# Altium schematic symbol library Electronic Devices_LIB.SchLib: 703 symbols (part 4 of 8)
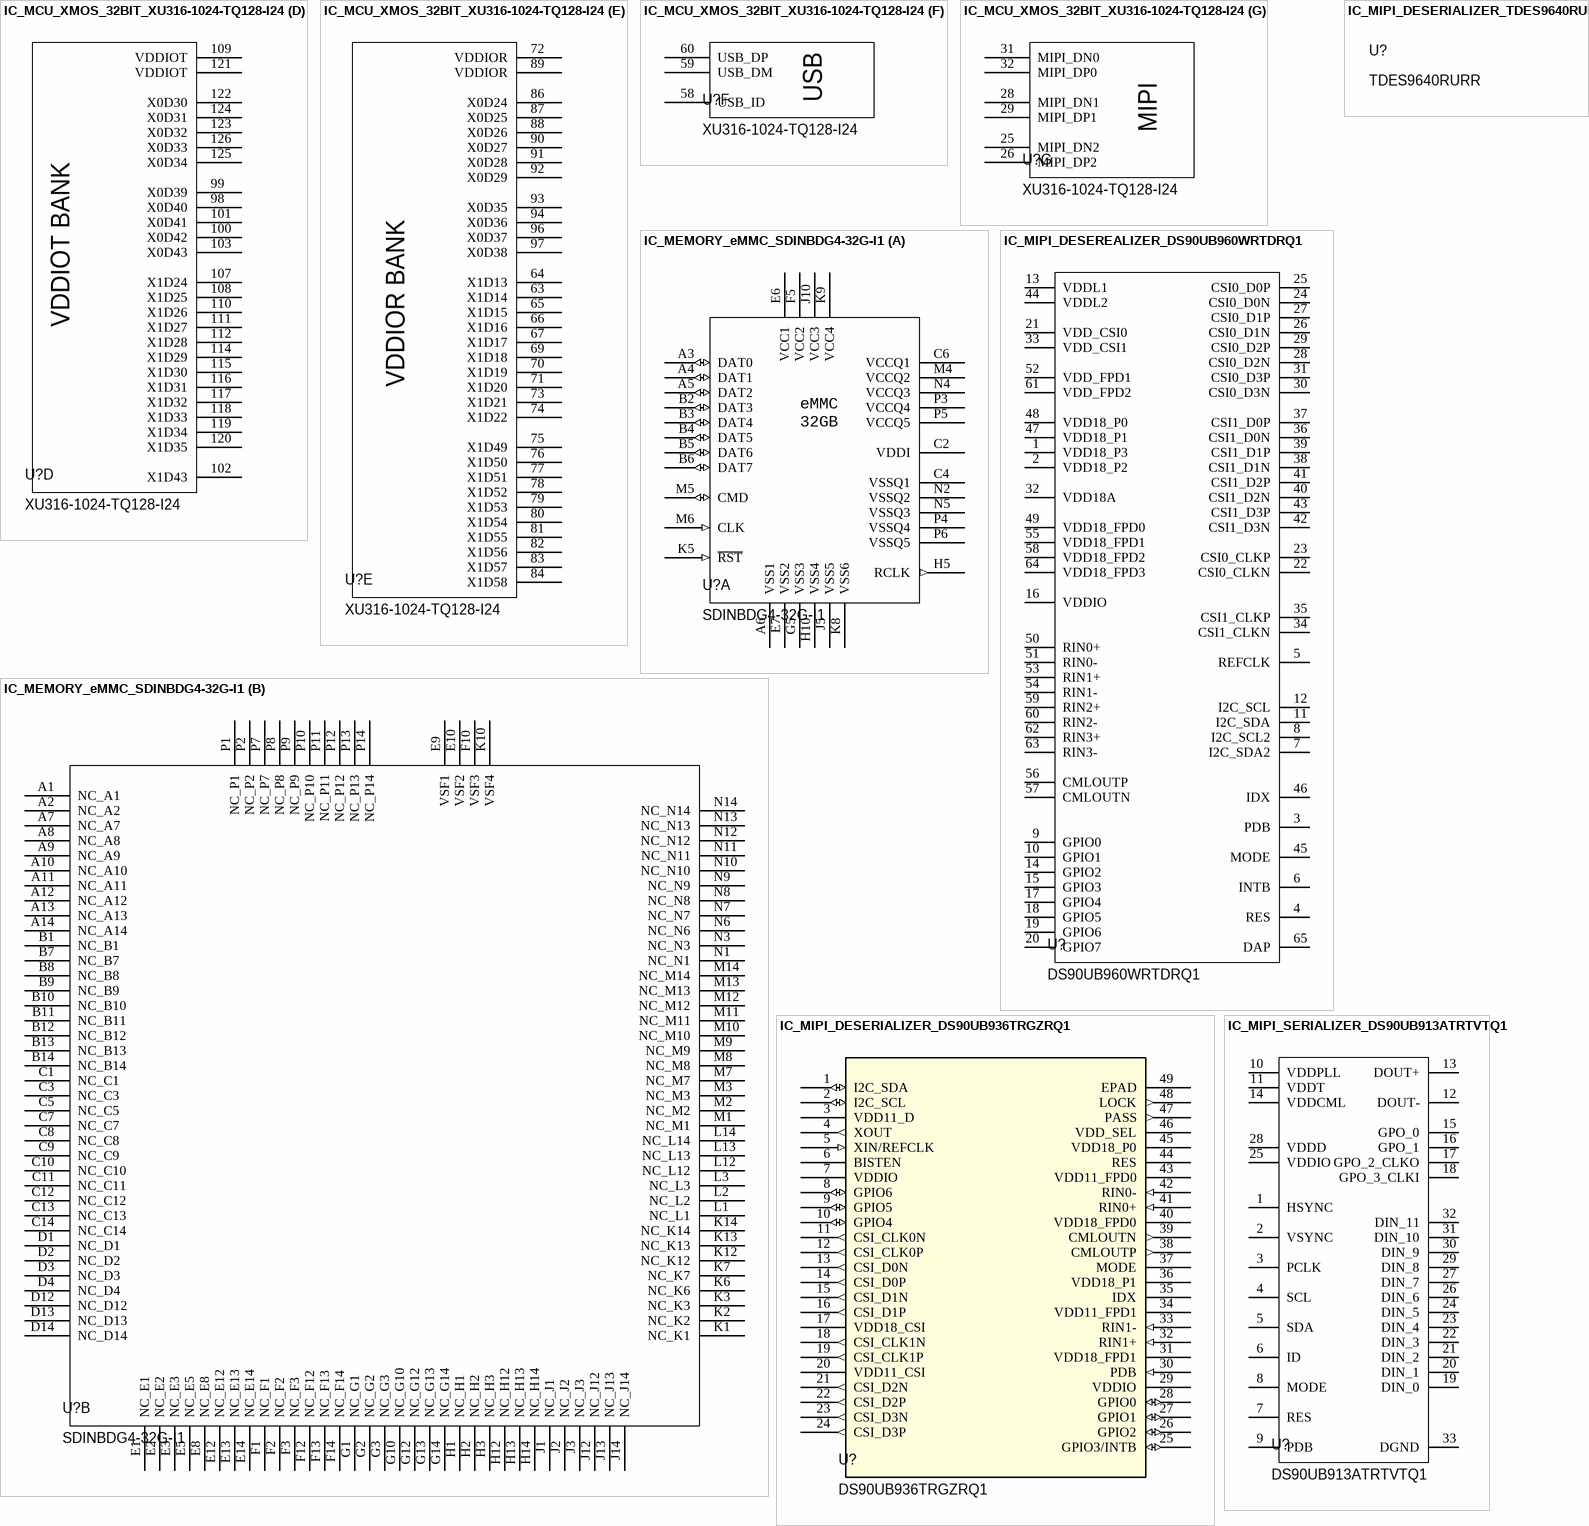
[diagram p39: symbols IC_MCU_XMOS_32BIT_XU316-1024-TQ128-I24 to IC_MIPI_SERIALIZER_DS90UB913ATRTVTQ1]

## IC_MIPI_DESERIALIZER_TDES9640RURR
designator U?, comment TDES9640RURR
7.55-Gbps MIPI® CSI-2 V³Link™ deserializer quad hub for high speed sensors 88-VQFNP -20 to 85; Manufacturer: Texas Instruments; Supplier 1: Digikey; Manufacturer Part Number: TDES9640RURR; RoHS: No; Stock 1: 2500; Pricing 1: 1=23.12, 10=18.537, 25=17.392, 100=16.1339, 250=15.53412, 500=15.17266, 2500=13.825 (USD); Supplier Part Number 1: 296-TDES9640RURRCT-ND

## IC_MIPI_SERIALIZER_DS90UB913ATRTVTQ1
designator U?, comment DS90UB913ATRTVTQ1
25- to 100-MHz, 10-bit & 12-bit FPD-Link III serializer 32-WQFN -40 to 105; Manufacturer: Texas Instruments; Number of Inputs: 12; Number of Outputs: 1; Max Supply Voltage: 1.89V; Min Supply Voltage: 1.71V; Operating Supply Voltage: 1.8V; Data Rate: 1.4Gbps; Supplier 1: Texas Instruments; Manufacturer Part Number: DS90UB913ATRTVTQ1; RoHS: Yes; Category: Integrated Circuits (ICs); Stock 1: 19901; Pricing 1: 1=6.813, 100=5.951, 250=4.588, 1000=4.104 (USD); Mount: Surface Mount; Number of Pins: 32; Min Operating Temperature: -40°C; Max Operating Temperature: 105°C; Packaging: Tape and Reel; Package Quantity: 250; Number of Elements: 1; Number of Drivers: 1; Series: Automotive, AEC-Q100; Radiation Hardening: No; Lead Free: Lead Free; RoHS Compliant: Yes; ComponentLink1URL: https://datasheet.ciiva.com/25651/ds90ub913a-q1-25651275.pdf?src-supplier=Digikey; ComponentLink1Description: https://datasheet.ciiva.com/25651/ds90ub913a-q1-25651275.pdf?src-supplier=Digikey; ComponentLink2URL: https://datasheet.ciiva.com/18624/ds90ub913a-q1-18624572.pdf?src-supplier=Digikey; ComponentLink2Description: https://datasheet.ciiva.com/18624/ds90ub913a-q1-18624572.pdf?src-supplier=Digikey; ComponentLink3URL: https://datasheet.ciiva.com/29643/ds90ub913a-q1-29643738.pdf?src-supplier=Digikey; ComponentLink3Description: https://datasheet.ciiva.com/29643/ds90ub913a-q1-29643738.pdf?src-supplier=Digikey; ComponentLink4URL: https://datasheet.ciiva.com/29891/ds90ub913a-q1-29891386.pdf?src-supplier=Avnet; ComponentLink4Description: https://datasheet.ciiva.com/29891/ds90ub913a-q1-29891386.pdf?src-supplier=Avnet; Supplier Part Number 1: DS90UB913ATRTVTQ1
footprint IC_SERIALIZER_QFN50P500X500X80-33N
pins: 1 HSYNC, 2 VSYNC, 3 PCLK, 4 SCL, 5 SDA, 6 ID, 7 RES, 8 MODE, 9 PDB, 10 VDDPLL (power), 11 VDDT (power), 12 DOUT-, 13 DOUT+, 14 VDDCML (power), 15 GPO_0, 16 GPO_1, 17 GPO_2_CLKO, 18 GPO_3_CLKI, 19 DIN_0, 20 DIN_1, 21 DIN_2, 22 DIN_3, 23 DIN_4, 24 DIN_5, 25 VDDIO, 26 DIN_6, 27 DIN_7, 28 VDDD, 29 DIN_8, 30 DIN_9, 31 DIN_10, 32 DIN_11, 33 DGND

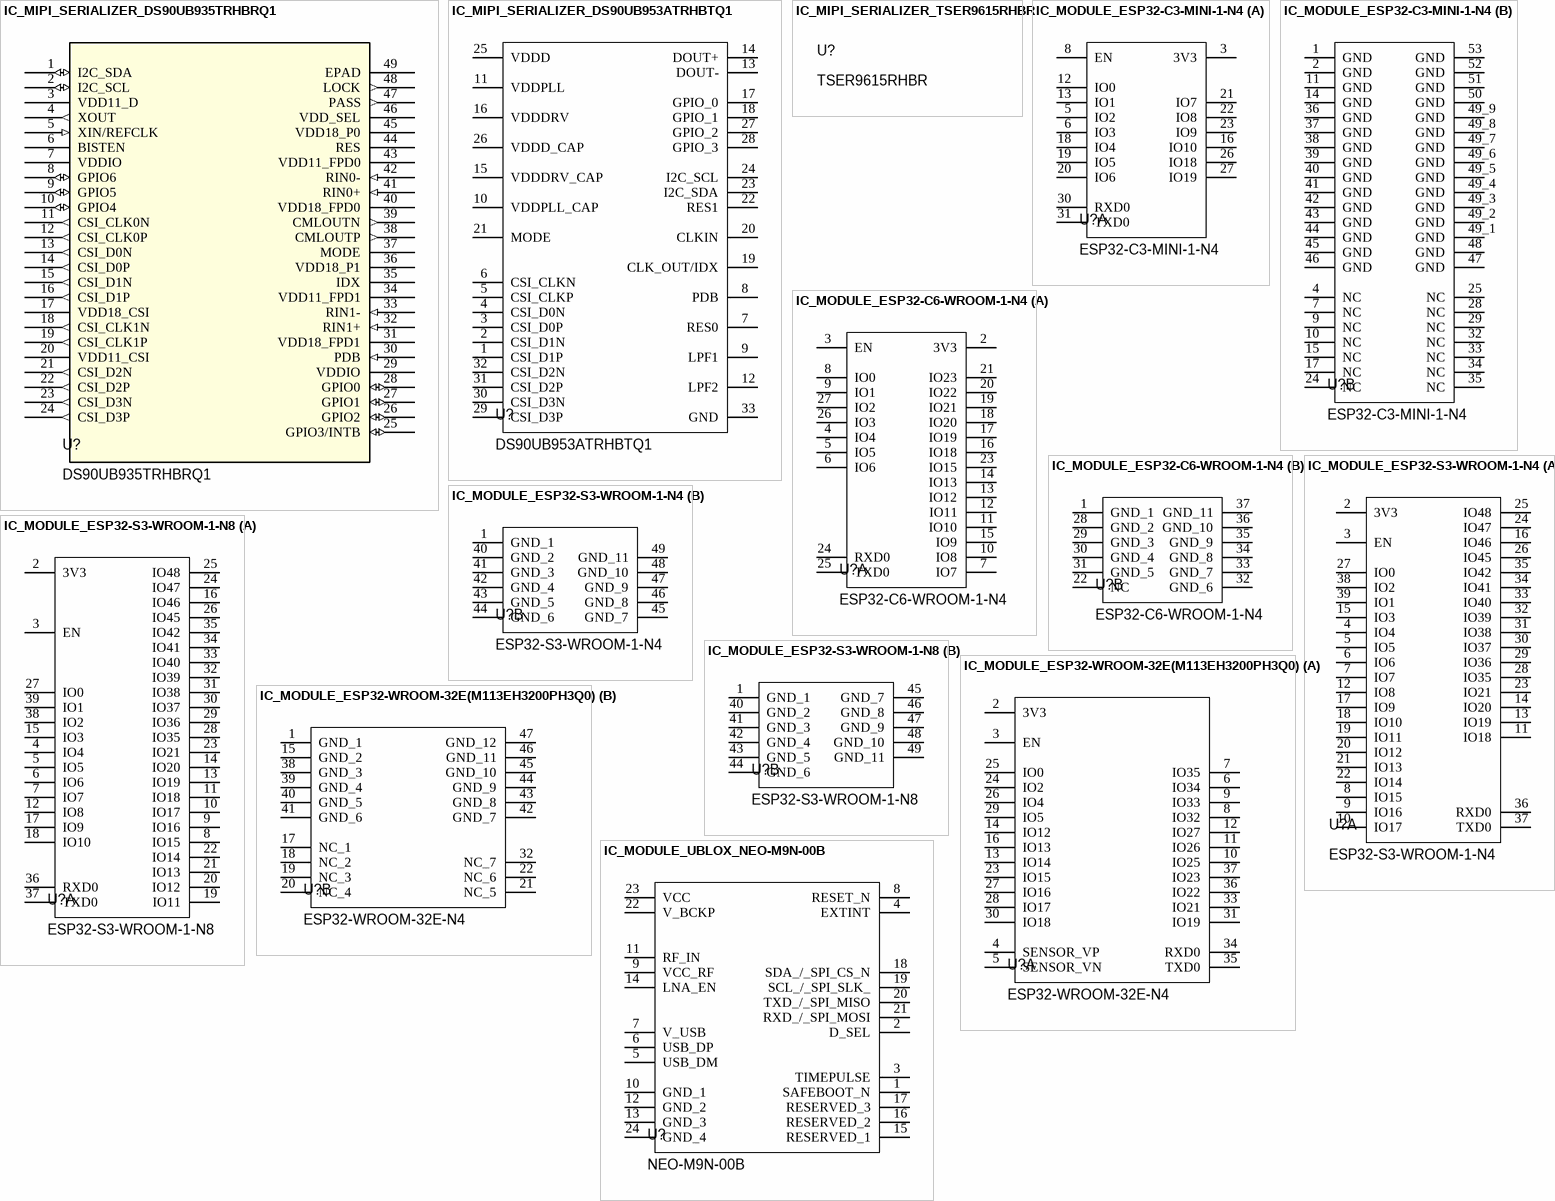
[diagram p14: symbols IC_MIPI_SERIALIZER_DS90UB935TRHBRQ1 to IC_MODULE_UBLOX_NEO-M9N-00B]

## IC_MIPI_SERIALIZER_DS90UB935TRHBRQ1
designator U?, comment DS90UB935TRHBRQ1
FPD-Link III 3-Gbps serializer with CSI-2 interface for 1 MP & 60 fps 32-VQFN -40 to 105; Manufacturer: Texas Instruments; Data Rate: 3Gbps; Number of Inputs: 10; Number of Outputs: 2; Supplier 1: Digikey; Manufacturer Part Number: DS90UB935TRHBRQ1; RoHS: Yes; Category: Integrated Circuits (ICs); Stock 1: 4984; Pricing 1: 1=6.91, 10=5.321, 25=4.9248, 100=4.4893, 250=4.28156, 500=4.15638, 1000=4.05336 (USD); Mount: Surface Mount; Case/Package: VQFN; Number of Pins: 32; Min Operating Temperature: -40°C; Max Operating Temperature: 105°C; Packaging: Cut Tape; Series: Automotive, AEC-Q100; Length: 5mm; Width: 5mm; Height: 1mm; Thickness: 900um; RoHS Compliant: Yes; ComponentLink1URL: http://www.ti.com/general/docs/suppproductinfo.tsp?distId=10&amp;gotoUrl=http%3A%2F%2Fwww.ti.com%2Flit%2Fgpn%2Fds90ub935-q1&src-supplier=Digikey; ComponentLink1Description: http://www.ti.com/general/docs/suppproductinfo.tsp?distId=10&amp;gotoUrl=http%3A%2F%2Fwww.ti.com%2Flit%2Fgpn%2Fds90ub935-q1&src-supplier=Digikey; Supplier Part Number 1: 296-51100-1-ND
footprint IC_SERIALIZER_RGZ48_TEX
pins: 1 I2C_SDA (io), 2 I2C_SCL (io), 3 VDD11_D (power), 4 XOUT (out), 5 XIN/REFCLK (in), 6 BISTEN, 7 VDDIO (power), 8 GPIO6 (io), 9 GPIO5 (io), 10 GPIO4 (io), 11 CSI_CLK0N (out), 12 CSI_CLK0P (out), 13 CSI_D0N (out), 14 CSI_D0P (out), 15 CSI_D1N (out), 16 CSI_D1P (out), 17 VDD18_CSI (power), 18 CSI_CLK1N (out), 19 CSI_CLK1P (out), 20 VDD11_CSI (power), 21 CSI_D2N (out), 22 CSI_D2P (out), 23 CSI_D3N (out), 24 CSI_D3P (out), 25 GPIO3/INTB (io), 26 GPIO2 (io), 27 GPIO1 (io), 28 GPIO0 (io), 29 VDDIO (power), 30 PDB (in), 31 VDD18_FPD1 (power), 32 RIN1+ (in), 33 RIN1- (in), 34 VDD11_FPD1 (power), 35 IDX, 36 VDD18_P1 (power), 37 MODE, 38 CMLOUTP (out), 39 CMLOUTN (out), 40 VDD18_FPD0 (power), 41 RIN0+ (in), 42 RIN0- (in), 43 VDD11_FPD0 (power), 44 RES, 45 VDD18_P0 (power), 46 VDD_SEL (power), 47 PASS (out), 48 LOCK (out), 49 EPAD

## IC_MIPI_SERIALIZER_DS90UB953ATRHBTQ1
designator U?, comment DS90UB953ATRHBTQ1
FPD-Link III 4.16-Gbps serializer with CSI-2 interface 32-VQFN -40 to 125; Manufacturer: Texas Instruments; Data Rate: 4.16Gbps; Number of Inputs: 5; Number of Outputs: 1; Supplier 1: Texas Instruments; Manufacturer Part Number: DS90UB953ATRHBTQ1; RoHS: Yes; Category: Integrated Circuits (ICs); Stock 1: 15937; Pricing 1: 1=10.375, 100=9.063, 250=6.988, 1000=6.25 (USD); Mount: Surface Mount; Case/Package: VQFN; Min Operating Temperature: -40°C; Max Operating Temperature: 125°C; Series: Automotive, AEC-Q100; ComponentLink1URL: http://www.ti.com/general/docs/suppproductinfo.tsp?distId=10&amp;gotoUrl=http%3A%2F%2Fwww.ti.com%2Flit%2Fgpn%2Fds90ub953a-q1&src-supplier=Digikey; ComponentLink1Description: http://www.ti.com/general/docs/suppproductinfo.tsp?distId=10&amp;gotoUrl=http%3A%2F%2Fwww.ti.com%2Flit%2Fgpn%2Fds90ub953a-q1&src-supplier=Digikey; Supplier Part Number 1: DS90UB953ATRHBTQ1
footprint IC_SERIALIZER_QFN50P500X500X100-33N-D
pins: 1 CSI_D1P, 2 CSI_D1N, 3 CSI_D0P, 4 CSI_D0N, 5 CSI_CLKP, 6 CSI_CLKN, 7 RES0, 8 PDB, 9 LPF1, 10 VDDPLL_CAP, 11 VDDPLL, 12 LPF2, 13 DOUT-, 14 DOUT+, 15 VDDDRV_CAP, 16 VDDDRV, 17 GPIO_0, 18 GPIO_1, 19 CLK_OUT/IDX, 20 CLKIN, 21 MODE, 22 RES1, 23 I2C_SDA, 24 I2C_SCL, 25 VDDD, 26 VDDD_CAP, 27 GPIO_2, 28 GPIO_3, 29 CSI_D3P, 30 CSI_D3N, 31 CSI_D2P, 32 CSI_D2N, 33 GND

## IC_MIPI_SERIALIZER_TSER9615RHBR
designator U?, comment TSER9615RHBR
7.55-Gbps MIPI® CSI-2 V³Link™ serializer for high-speed sensors 32-VQFN -20 to 85; Manufacturer: Texas Instruments; Supplier 1: Digikey; Manufacturer Part Number: TSER9615RHBR; RoHS: No; Stock 1: 3000; Pricing 1: 1=9.34, 10=7.269, 25=6.752, 100=6.1835, 250=5.9124, 500=5.74902, 1000=5.61455, 3000=5.1125 (USD); Case/Package: VQFN; Number of Pins: 32; Length: 5mm; Width: 5mm; Height: 1mm; Thickness: 900um; Supplier Part Number 1: 296-TSER9615RHBRCT-ND

## IC_MODULE_ESP32-C3-MINI-1-N4
designator U?, comment ESP32-C3-MINI-1-N4
Multiprotocol Modules SMD module, ESP32-C3FN4, PCB antenna, -40 C +85 C; Manufacturer: Espressif Systems; Supplier 1: Digikey; Manufacturer Part Number: ESP32-C3-MINI-1-N4; RoHS: No; Category: LDO; Stock 1: 26373; Pricing 1: 1=1.8 (USD); ComponentLink1URL: https://datasheet.octopart.com/ESP32-C3-MINI-1-N4-Espressif-Systems-datasheet-165560559.pdf?src-supplier=TME; ComponentLink1Description: https://datasheet.octopart.com/ESP32-C3-MINI-1-N4-Espressif-Systems-datasheet-165560559.pdf?src-supplier=TME; ComponentLink2URL: https://datasheet.octopart.com/ESP32-C3-MINI-1-N4-Espressif-Systems-datasheet-154717747.pdf?src-supplier=SOS+electronic; ComponentLink2Description: https://datasheet.octopart.com/ESP32-C3-MINI-1-N4-Espressif-Systems-datasheet-154717747.pdf?src-supplier=SOS+electronic; Supplier Part Number 1: 1965-ESP32-C3-MINI-1-N4CT-ND
footprint XCVR_ESP32-C3-MINI-1-N4
part A pins: 3 3V3, 5 IO2, 6 IO3, 8 EN, 12 IO0, 13 IO1, 16 IO10, 18 IO4, 19 IO5, 20 IO6, 21 IO7, 22 IO8, 23 IO9, 26 IO18, 27 IO19, 30 RXD0, 31 TXD0
part B pins: 1 GND (power), 2 GND (power), 4 NC, 7 NC, 9 NC, 10 NC, 11 GND (power), 14 GND (power), 15 NC, 17 NC, 24 NC, 25 NC, 28 NC, 29 NC, 32 NC, 33 NC, 34 NC, 35 NC, 36 GND (power), 37 GND (power), 38 GND (power), 39 GND (power), 40 GND (power), 41 GND (power), 42 GND (power), 43 GND (power), 44 GND (power), 45 GND (power), 46 GND (power), 47 GND (power), 48 GND (power), 49_1 GND (power), 49_2 GND (power), 49_3 GND (power), 49_4 GND (power), 49_5 GND (power), 49_6 GND (power), 49_7 GND (power), 49_8 GND (power), 49_9 GND (power), 50 GND (power), 51 GND (power), 52 GND (power), 53 GND (power)

## IC_MODULE_ESP32-C6-WROOM-1-N4
designator U?, comment ESP32-C6-WROOM-1-N4
ESP32-C6-WROOM-1-N4 Engineering Module - 4 MB Quad SPI Flash; Manufacturer: Espressif Systems; Supplier 1: Digikey; Manufacturer Part Number: ESP32-C6-WROOM-1-N4; RoHS: No; Category: LDO; Stock 1: 4715; Pricing 1: 1=2.85 (USD); Supplier Part Number 1: 1965-ESP32-C6-WROOM-1-N4CT-ND
footprint IC_MODULE_ESP32C6WROOM1N4
part A pins: 2 3V3, 3 EN, 4 IO4, 5 IO5, 6 IO6, 7 IO7, 8 IO0, 9 IO1, 10 IO8, 11 IO10, 12 IO11, 13 IO12, 14 IO13, 15 IO9, 16 IO18, 17 IO19, 18 IO20, 19 IO21, 20 IO22, 21 IO23, 23 IO15, 24 RXD0, 25 TXD0, 26 IO3, 27 IO2
part B pins: 1 GND_1, 22 NC, 28 GND_2, 29 GND_3, 30 GND_4, 31 GND_5, 32 GND_6, 33 GND_7, 34 GND_8, 35 GND_9, 36 GND_10, 37 GND_11

## IC_MODULE_ESP32-S3-WROOM-1-N4
designator U?, comment ESP32-S3-WROOM-1-N4
WiFi-Modul 802.11/BT 2, 4-2, 5GHz 150Mb/s; Manufacturer: Espressif Systems; Supplier 1: Digi-Key; Manufacturer Part Number: ESP32-S3-WROOM-1-N4; RoHS: No; Category: Uncategorized; Stock 1: 1280; Pricing 1: 1=2.95 (USD); Supplier Part Number 1: 1965-ESP32-S3-WROOM-1-N4CT-ND
footprint IC_MODULE_ESP32S3WROOM1N4 (41-SMD Module)
part A pins: 2 3V3, 3 EN, 4 IO4, 5 IO5, 6 IO6, 7 IO7, 8 IO15, 9 IO16, 10 IO17, 11 IO18, 12 IO8, 13 IO19, 14 IO20, 15 IO3, 16 IO46, 17 IO9, 18 IO10, 19 IO11, 20 IO12, 21 IO13, 22 IO14, 23 IO21, 24 IO47, 25 IO48, 26 IO45, 27 IO0, 28 IO35, 29 IO36, 30 IO37, 31 IO38, 32 IO39, 33 IO40, 34 IO41, 35 IO42, 36 RXD0, 37 TXD0, 38 IO2, 39 IO1
part B pins: 1 GND_1, 40 GND_2, 41 GND_3, 42 GND_4, 43 GND_5, 44 GND_6, 45 GND_7, 46 GND_8, 47 GND_9, 48 GND_10, 49 GND_11

## IC_MODULE_ESP32-S3-WROOM-1-N8
designator U?, comment ESP32-S3-WROOM-1-N8
SMD module, ESP32-S3, 8 MB SPI flash, PCB antenna; Manufacturer: Espressif Systems; Supplier 1: Digikey; Manufacturer Part Number: ESP32-S3-WROOM-1-N8; RoHS: No; Category: LDO; Stock 1: 4985; Pricing 1: 1=3.2 (USD); ComponentLink1URL: https://datasheet.octopart.com/ESP32-S3-WROOM-1-N8-Espressif-Systems-datasheet-165560563.pdf?src-supplier=TME; ComponentLink1Description: https://datasheet.octopart.com/ESP32-S3-WROOM-1-N8-Espressif-Systems-datasheet-165560563.pdf?src-supplier=TME; Supplier Part Number 1: 1965-ESP32-S3-WROOM-1-N8CT-ND
footprint IC_MODULE_ESP32S3WROOM1N8
part A pins: 2 3V3, 3 EN, 4 IO4, 5 IO5, 6 IO6, 7 IO7, 8 IO15, 9 IO16, 10 IO17, 11 IO18, 12 IO8, 13 IO19, 14 IO20, 15 IO3, 16 IO46, 17 IO9, 18 IO10, 19 IO11, 20 IO12, 21 IO13, 22 IO14, 23 IO21, 24 IO47, 25 IO48, 26 IO45, 27 IO0, 28 IO35, 29 IO36, 30 IO37, 31 IO38, 32 IO39, 33 IO40, 34 IO41, 35 IO42, 36 RXD0, 37 TXD0, 38 IO2, 39 IO1
part B pins: 1 GND_1, 40 GND_2, 41 GND_3, 42 GND_4, 43 GND_5, 44 GND_6, 45 GND_7, 46 GND_8, 47 GND_9, 48 GND_10, 49 GND_11

## IC_MODULE_ESP32-WROOM-32E(M113EH3200PH3Q0)
designator U?, comment ESP32-WROOM-32E-N4
SMD module, ESP32-D0WD-V3, ESP32 ECO V3, 4 MB SPI flash, PCB antenna; Manufacturer: Espressif Systems; Manufacturer Part Number: ESP32-WROOM-32E(M113EH3200PH3Q0); Supplier 1: Digi-Key; RoHS: No; Category: RF Receivers, Transceivers; Stock 1: 13000; Pricing 1: 650=2.94 (USD); Supplier Part Number 1: 1965-ESP32-WROOM-32E-N4TR-ND
footprint IC_MODULE_ESP32WROOM32EN4 (38-SMD Module)
part A pins: 2 3V3, 3 EN, 4 SENSOR_VP, 5 SENSOR_VN, 6 IO34, 7 IO35, 8 IO32, 9 IO33, 10 IO25, 11 IO26, 12 IO27, 13 IO14, 14 IO12, 16 IO13, 23 IO15, 24 IO2, 25 IO0, 26 IO4, 27 IO16, 28 IO17, 29 IO5, 30 IO18, 31 IO19, 33 IO21, 34 RXD0, 35 TXD0, 36 IO22, 37 IO23
part B pins: 1 GND_1, 15 GND_2, 17 NC_1, 18 NC_2, 19 NC_3, 20 NC_4, 21 NC_5, 22 NC_6, 32 NC_7, 38 GND_3, 39 GND_4, 40 GND_5, 41 GND_6, 42 GND_7, 43 GND_8, 44 GND_9, 45 GND_10, 46 GND_11, 47 GND_12

## IC_MODULE_UBLOX_NEO-M9N-00B
designator U?, comment NEO-M9N-00B
GNSS module, Flash, TCXO, SAW, LNA, LCC, 12x16 mm Professional Grade; Manufacturer: u-blox; Supplier 1: Mouser; Manufacturer Part Number: NEO-M9N-00B; RoHS: Yes; Category: RF Receivers, Transceivers; Stock 1: 8287; Pricing 1: 1=27, 10=23.92, 50=19.61, 100=15.68, 250=15.68, 1000=15.68, 10000=15.68 (USD); RoHS Compliant: Yes; ComponentLink1URL: https://datasheet.octopart.com/NEO-M9N-00B-u-blox-datasheet-166813760.pdf?src-supplier=Future+Electronics; ComponentLink1Description: https://datasheet.octopart.com/NEO-M9N-00B-u-blox-datasheet-166813760.pdf?src-supplier=Future+Electronics; ComponentLink2URL: https://datasheet.octopart.com/NEO-M9N-00B-u-blox-datasheet-166811447.pdf?src-supplier=TME; ComponentLink2Description: https://datasheet.octopart.com/NEO-M9N-00B-u-blox-datasheet-166811447.pdf?src-supplier=TME; Supplier Part Number 1: 377-NEO-M9N-00B
footprint IC_MODULE_UBLOX_NEOM9N00B
pins: 1 SAFEBOOT_N, 2 D_SEL, 3 TIMEPULSE, 4 EXTINT, 5 USB_DM, 6 USB_DP, 7 V_USB, 8 RESET_N, 9 VCC_RF, 10 GND_1, 11 RF_IN, 12 GND_2, 13 GND_3, 14 LNA_EN, 15 RESERVED_1, 16 RESERVED_2, 17 RESERVED_3, 18 SDA_/_SPI_CS_N, 19 SCL_/_SPI_SLK_, 20 TXD_/_SPI_MISO, 21 RXD_/_SPI_MOSI, 22 V_BCKP, 23 VCC, 24 GND_4

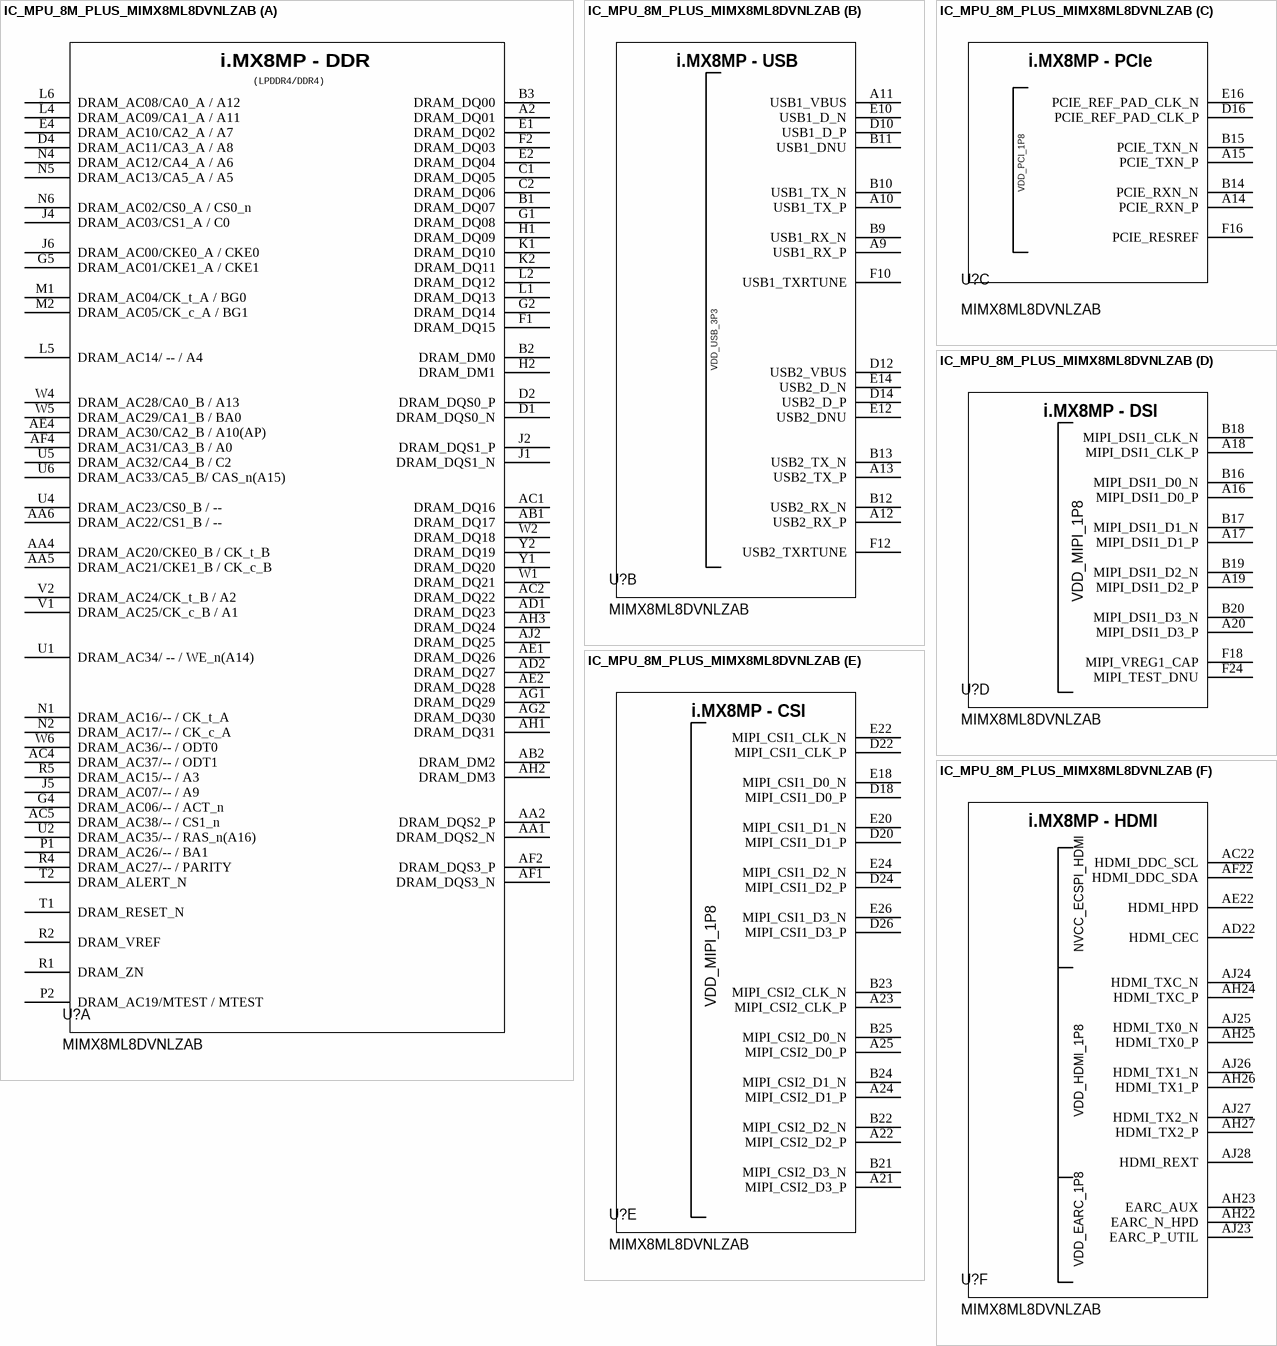
[diagram p15: symbol IC_MPU_8M_PLUS_MIMX8ML8DVNLZAB]

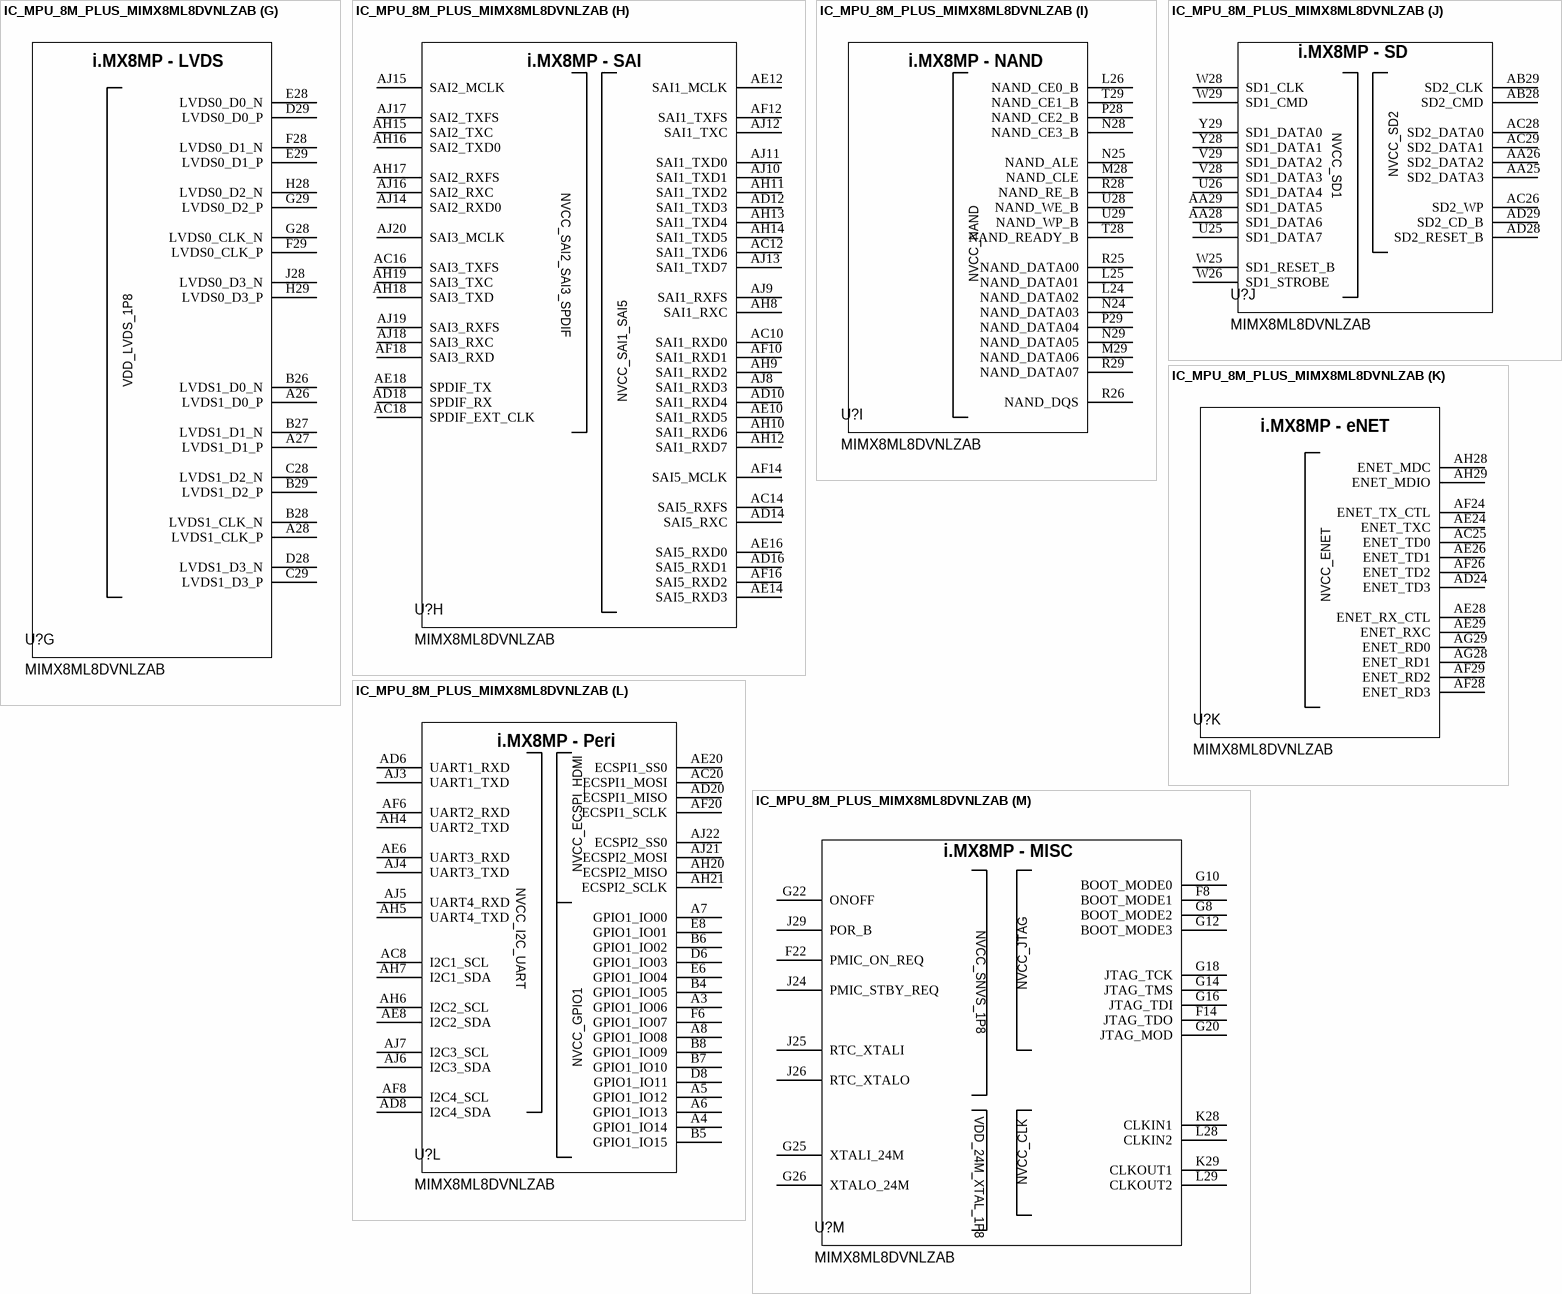
[diagram p16: symbol IC_MPU_8M_PLUS_MIMX8ML8DVNLZAB]

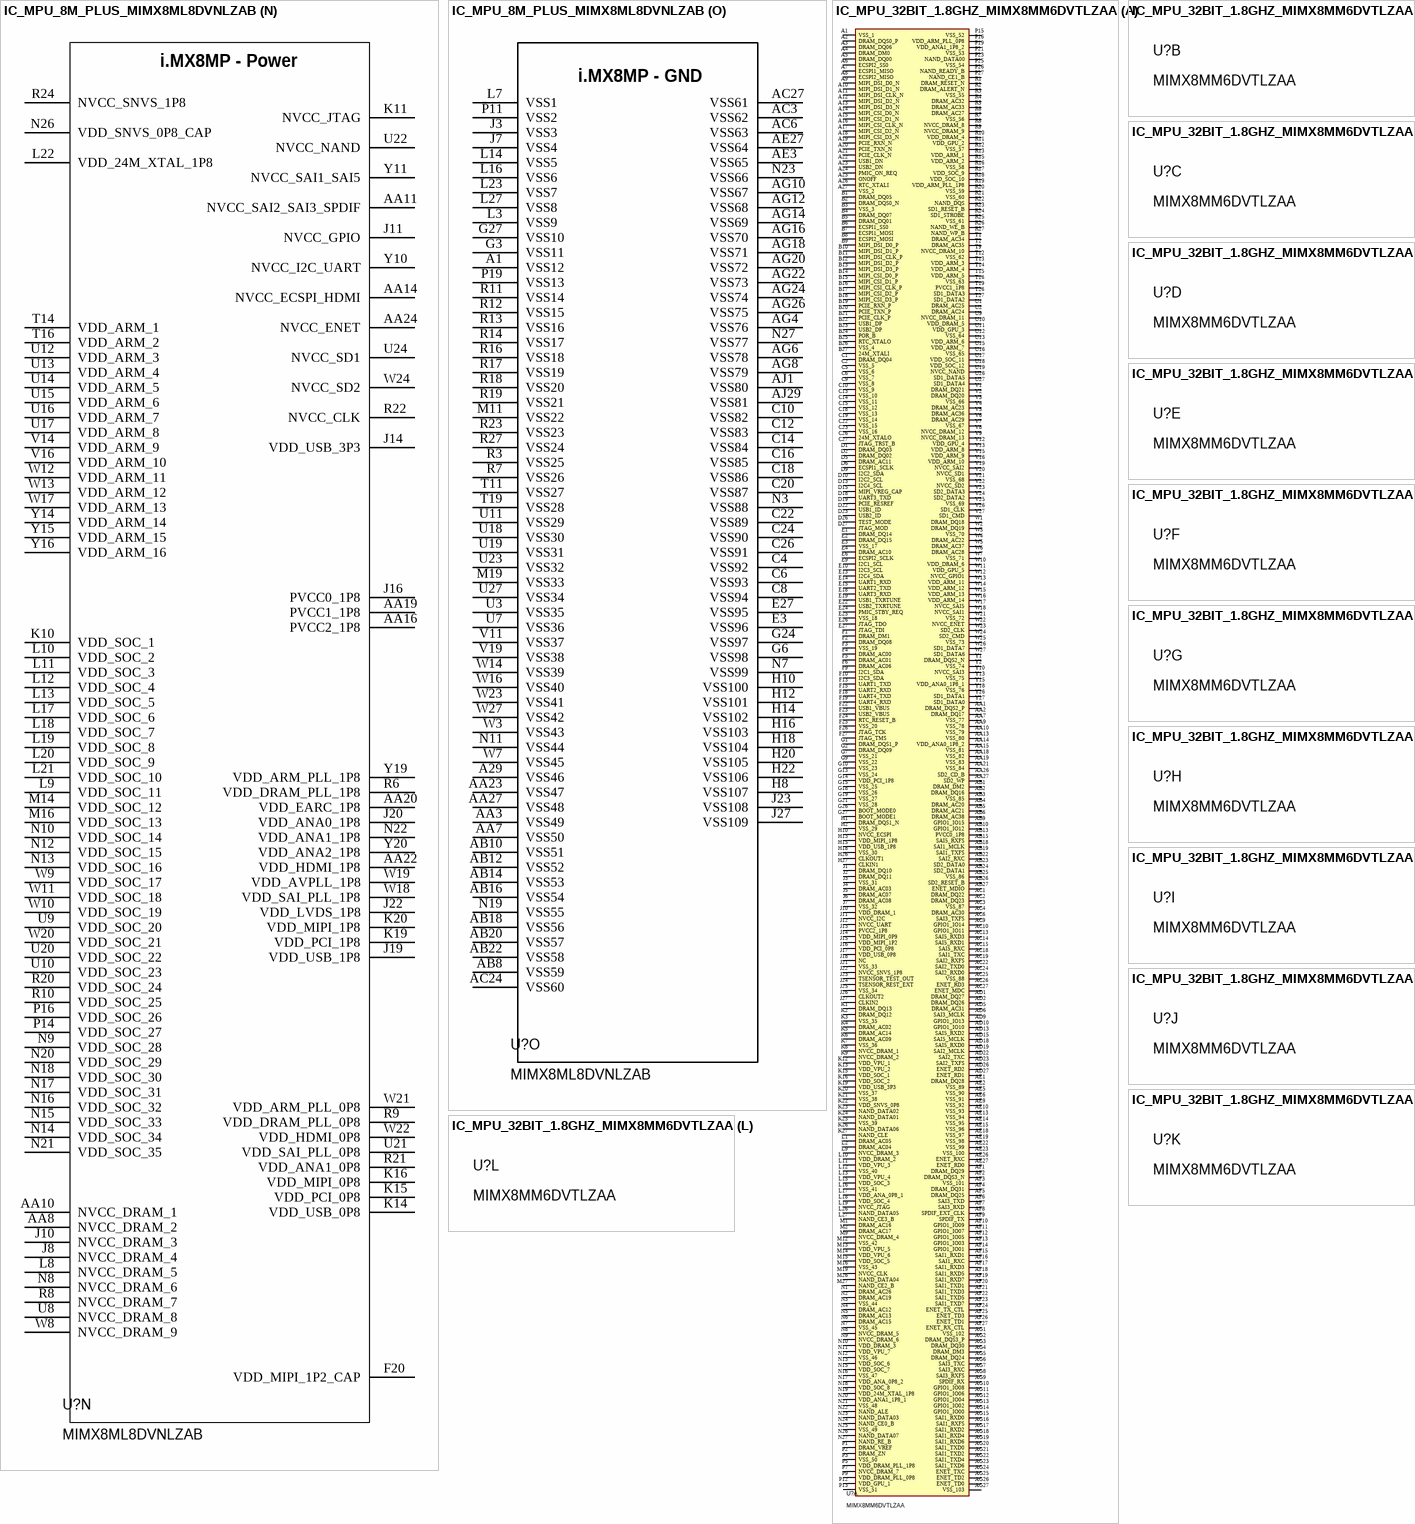
[diagram p17: symbols IC_MPU_8M_PLUS_MIMX8ML8DVNLZAB to IC_MPU_32BIT_1.8GHZ_MIMX8MM6DVTLZAA]

## IC_MPU_8M_PLUS_MIMX8ML8DVNLZAB
designator U?, comment MIMX8ML8DVNLZAB
i.MX 8M Plus, Consumer, / TRAY TRAY MULTIPLE DP BAKEABLE RoHS Compliant: Yes; Manufacturer: NXP Semiconductors; Supplier 1: Arrow Electronics; Manufacturer Part Number: MIMX8ML8DVNLZAB; RoHS: Yes; Category: Microprocessors; Stock 1: 1036; Pricing 1: 1=54.8, 5=52.24, 10=44.19, 25=42.8, 50=39.95, 100=31.83 (USD); Supplier Part Number 1: MIMX8ML8DVNLZAB
footprint IC_MPU_BGA548C50P29X29_1500X1500X148 (15 X 15 MM BGA)
part A pins: A2 DRAM_DQ01, AA1 DRAM_DQS2_N, AA2 DRAM_DQS2_P, AA4 DRAM_AC20/CKE0_B / CK_t_B, AA5 DRAM_AC21/CKE1_B / CK_c_B, AA6 DRAM_AC22/CS1_B / --, AB1 DRAM_DQ17, AB2 DRAM_DM2, AC1 DRAM_DQ16, AC2 DRAM_DQ22, AC4 DRAM_AC37/-- / ODT1, AC5 DRAM_AC38/-- / CS1_n, AD1 DRAM_DQ23, AD2 DRAM_DQ27, AE1 DRAM_DQ26, AE2 DRAM_DQ28, AE4 DRAM_AC30/CA2_B / A10(AP), AF1 DRAM_DQS3_N, AF2 DRAM_DQS3_P, AF4 DRAM_AC31/CA3_B / A0, AG1 DRAM_DQ29, AG2 DRAM_DQ30, AH1 DRAM_DQ31, AH2 DRAM_DM3, AH3 DRAM_DQ24, AJ2 DRAM_DQ25, B1 DRAM_DQ07, B2 DRAM_DM0, B3 DRAM_DQ00, C1 DRAM_DQ05, C2 DRAM_DQ06, D1 DRAM_DQS0_N, D2 DRAM_DQS0_P, D4 DRAM_AC11/CA3_A / A8, E1 DRAM_DQ02, E2 DRAM_DQ04, E4 DRAM_AC10/CA2_A / A7, F1 DRAM_DQ15, F2 DRAM_DQ03, G1 DRAM_DQ08, G2 DRAM_DQ14, G4 DRAM_AC06/-- / ACT_n, G5 DRAM_AC01/CKE1_A / CKE1, H1 DRAM_DQ09, H2 DRAM_DM1, J1 DRAM_DQS1_N, J2 DRAM_DQS1_P, J4 DRAM_AC03/CS1_A / C0, J5 DRAM_AC07/-- / A9, J6 DRAM_AC00/CKE0_A / CKE0, K1 DRAM_DQ10, K2 DRAM_DQ11, L1 DRAM_DQ13, L2 DRAM_DQ12, L4 DRAM_AC09/CA1_A / A11, L5 DRAM_AC14/ -- / A4, L6 DRAM_AC08/CA0_A / A12, M1 DRAM_AC04/CK_t_A / BG0, M2 DRAM_AC05/CK_c_A / BG1, N1 DRAM_AC16/-- / CK_t_A, N2 DRAM_AC17/-- / CK_c_A, N4 DRAM_AC12/CA4_A / A6, N5 DRAM_AC13/CA5_A / A5, N6 DRAM_AC02/CS0_A / CS0_n, P1 DRAM_AC26/-- / BA1, P2 DRAM_AC19/MTEST / MTEST, R1 DRAM_ZN, R2 DRAM_VREF, R4 DRAM_AC27/-- / PARITY, R5 DRAM_AC15/-- / A3, T1 DRAM_RESET_N, T2 DRAM_ALERT_N, U1 DRAM_AC34/ -- / WE_n(A14), U2 DRAM_AC35/-- / RAS_n(A16), U4 DRAM_AC23/CS0_B / --, U5 DRAM_AC32/CA4_B / C2, U6 DRAM_AC33/CA5_B/ CAS_n(A15), V1 DRAM_AC25/CK_c_B / A1, V2 DRAM_AC24/CK_t_B / A2, W1 DRAM_DQ21, W2 DRAM_DQ18, W4 DRAM_AC28/CA0_B / A13, W5 DRAM_AC29/CA1_B / BA0, W6 DRAM_AC36/-- / ODT0, Y1 DRAM_DQ20, Y2 DRAM_DQ19
part B pins: A9 USB1_RX_P, A10 USB1_TX_P, A11 USB1_VBUS, A12 USB2_RX_P, A13 USB2_TX_P, B9 USB1_RX_N, B10 USB1_TX_N, B11 USB1_DNU, B12 USB2_RX_N, B13 USB2_TX_N, D10 USB1_D_P, D12 USB2_VBUS, D14 USB2_D_P, E10 USB1_D_N, E12 USB2_DNU, E14 USB2_D_N, F10 USB1_TXRTUNE, F12 USB2_TXRTUNE
part C pins: A14 PCIE_RXN_P, A15 PCIE_TXN_P, B14 PCIE_RXN_N, B15 PCIE_TXN_N, D16 PCIE_REF_PAD_CLK_P, E16 PCIE_REF_PAD_CLK_N, F16 PCIE_RESREF
part D pins: A16 MIPI_DSI1_D0_P, A17 MIPI_DSI1_D1_P, A18 MIPI_DSI1_CLK_P, A19 MIPI_DSI1_D2_P, A20 MIPI_DSI1_D3_P, B16 MIPI_DSI1_D0_N, B17 MIPI_DSI1_D1_N, B18 MIPI_DSI1_CLK_N, B19 MIPI_DSI1_D2_N, B20 MIPI_DSI1_D3_N, F18 MIPI_VREG1_CAP, F24 MIPI_TEST_DNU
part E pins: A21 MIPI_CSI2_D3_P, A22 MIPI_CSI2_D2_P, A23 MIPI_CSI2_CLK_P, A24 MIPI_CSI2_D1_P, A25 MIPI_CSI2_D0_P, B21 MIPI_CSI2_D3_N, B22 MIPI_CSI2_D2_N, B23 MIPI_CSI2_CLK_N, B24 MIPI_CSI2_D1_N, B25 MIPI_CSI2_D0_N, D18 MIPI_CSI1_D0_P, D20 MIPI_CSI1_D1_P, D22 MIPI_CSI1_CLK_P, D24 MIPI_CSI1_D2_P, D26 MIPI_CSI1_D3_P, E18 MIPI_CSI1_D0_N, E20 MIPI_CSI1_D1_N, E22 MIPI_CSI1_CLK_N, E24 MIPI_CSI1_D2_N, E26 MIPI_CSI1_D3_N
part F pins: AC22 HDMI_DDC_SCL, AD22 HDMI_CEC, AE22 HDMI_HPD, AF22 HDMI_DDC_SDA, AH22 EARC_N_HPD, AH23 EARC_AUX, AH24 HDMI_TXC_P, AH25 HDMI_TX0_P, AH26 HDMI_TX1_P, AH27 HDMI_TX2_P, AJ23 EARC_P_UTIL, AJ24 HDMI_TXC_N, AJ25 HDMI_TX0_N, AJ26 HDMI_TX1_N, AJ27 HDMI_TX2_N, AJ28 HDMI_REXT
part G pins: A26 LVDS1_D0_P, A27 LVDS1_D1_P, A28 LVDS1_CLK_P, B26 LVDS1_D0_N, B27 LVDS1_D1_N, B28 LVDS1_CLK_N, B29 LVDS1_D2_P, C28 LVDS1_D2_N, C29 LVDS1_D3_P, D28 LVDS1_D3_N, D29 LVDS0_D0_P, E28 LVDS0_D0_N, E29 LVDS0_D1_P, F28 LVDS0_D1_N, F29 LVDS0_CLK_P, G28 LVDS0_CLK_N, G29 LVDS0_D2_P, H28 LVDS0_D2_N, H29 LVDS0_D3_P, J28 LVDS0_D3_N
part H pins: AC10 SAI1_RXD0, AC12 SAI1_TXD6, AC14 SAI5_RXFS, AC16 SAI3_TXFS, AC18 SPDIF_EXT_CLK, AD10 SAI1_RXD4, AD12 SAI1_TXD3, AD14 SAI5_RXC, AD16 SAI5_RXD1, AD18 SPDIF_RX, AE10 SAI1_RXD5, AE12 SAI1_MCLK, AE14 SAI5_RXD3, AE16 SAI5_RXD0, AE18 SPDIF_TX, AF10 SAI1_RXD1, AF12 SAI1_TXFS, AF14 SAI5_MCLK, AF16 SAI5_RXD2, AF18 SAI3_RXD, AH8 SAI1_RXC, AH9 SAI1_RXD2, AH10 SAI1_RXD6, AH11 SAI1_TXD2, AH12 SAI1_RXD7, AH13 SAI1_TXD4, AH14 SAI1_TXD5, AH15 SAI2_TXC, AH16 SAI2_TXD0, AH17 SAI2_RXFS, AH18 SAI3_TXD, AH19 SAI3_TXC, AJ8 SAI1_RXD3, AJ9 SAI1_RXFS, AJ10 SAI1_TXD1, AJ11 SAI1_TXD0, AJ12 SAI1_TXC, AJ13 SAI1_TXD7, AJ14 SAI2_RXD0, AJ15 SAI2_MCLK, AJ16 SAI2_RXC, AJ17 SAI2_TXFS, AJ18 SAI3_RXC, AJ19 SAI3_RXFS, AJ20 SAI3_MCLK
part I pins: L24 NAND_DATA02, L25 NAND_DATA01, L26 NAND_CE0_B, M28 NAND_CLE, M29 NAND_DATA06, N24 NAND_DATA03, N25 NAND_ALE, N28 NAND_CE3_B, N29 NAND_DATA05, P28 NAND_CE2_B, P29 NAND_DATA04, R25 NAND_DATA00, R26 NAND_DQS, R28 NAND_RE_B, R29 NAND_DATA07, T28 NAND_READY_B, T29 NAND_CE1_B, U28 NAND_WE_B, U29 NAND_WP_B
part J pins: AA25 SD2_DATA3, AA26 SD2_DATA2, AA28 SD1_DATA6, AA29 SD1_DATA5, AB28 SD2_CMD, AB29 SD2_CLK, AC26 SD2_WP, AC28 SD2_DATA0, AC29 SD2_DATA1, AD28 SD2_RESET_B, AD29 SD2_CD_B, U25 SD1_DATA7, U26 SD1_DATA4, V28 SD1_DATA3, V29 SD1_DATA2, W25 SD1_RESET_B, W26 SD1_STROBE, W28 SD1_CLK, W29 SD1_CMD, Y28 SD1_DATA1, Y29 SD1_DATA0